# Altium footprint library 医疗床16x16.PcbLib: 38 footprints (part 3 of 3)
Each footprint in its own frame and in the unit in brackets; x right, y up, seen from the top. Pads: shape width x height; smd on the part's side, far side on the other; paste and mask are expansions set on the pad; w line width, h text height; cw(c..) or ccw(c..) is an arc to the next point about the centre after c.
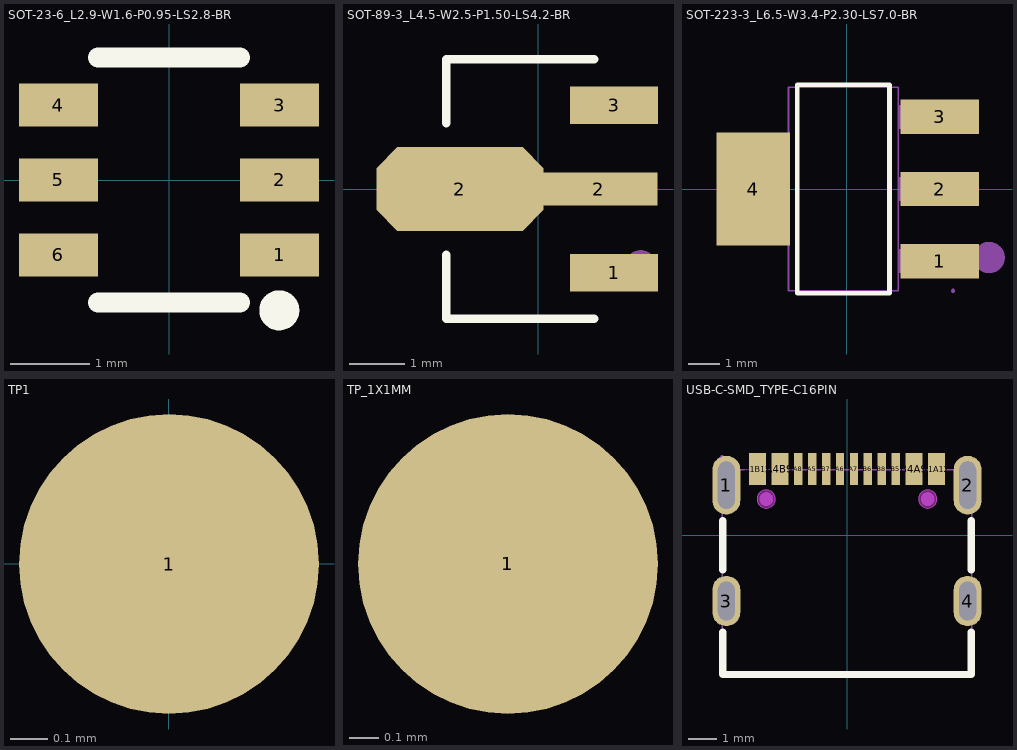
[diagram p2: the footprints below, top view; thin cyan lines are the x and y axes]

## SOT-23-6_L2.9-W1.6-P0.95-LS2.8-BR [mm]
pads (6):
  rect 1x0.55 smd: 1(1.4,-0.95) 2(1.4,0) 3(1.4,0.95) 4(-1.4,0.95) 5(-1.4,0) 6(-1.4,-0.95)
Top Overlay:
  circle w0.254: c1.397,-1.651 r0.127
  lines w0.254: -0.9,-1.55 0.9,-1.55 ; -0.9,1.55 0.9,1.55
Mechanical 15:
  circle w0.2: c1.4,-0.95 r0.1
3D body "SOT23-6.STEP": height 1.15, standoff -0.03, extent -1.403,-1.5 1.403,1.5

## SOT-89-3_L4.5-W2.5-P1.50-LS4.2-BR [mm]
pads (4):
  rect 1.575x0.672 smd: 1(1.356,-1.5) 3(1.356,1.5)
  oct 3x1.5 smd: 2(-1.405,0)
  rect 2.1x0.6 smd: 2(1.084,0)
Top Overlay:
  lines w0.152: -1.65,-1.177 -1.65,-2.326 1.002,-2.326 ; -1.65,1.177 -1.65,2.326 1.002,2.326
Top Solder:
  region: -2.283,0.959 -0.429,0.959 -0.385,0.958 -0.34,0.955 -0.296,0.949 -0.252,0.942 -0.208,0.933 -0.165,0.921 -0.123,0.908 -0.081,0.893 -0.04,0.875 0,0.856 0.039,0.835 0.078,0.812 0.115,0.788 0.151,0.761 0.185,0.733 0.219,0.704 0.25,0.673 0.281,0.64 0.31,0.606 0.337,0.571 0.362,0.534 0.386,0.497 0.408,0.458 0.428,0.418 0.446,0.339 2.144,0.339 2.144,-0.321 0.446,-0.321 0.428,-0.401 0.408,-0.44 0.386,-0.479 0.362,-0.517 0.337,-0.553 0.31,-0.588 0.281,-0.622 0.25,-0.655 0.219,-0.686 0.185,-0.716 0.151,-0.744 0.115,-0.77 0.078,-0.795 0.039,-0.818 0,-0.839 -0.04,-0.858 -0.081,-0.875 -0.123,-0.89 -0.165,-0.904 -0.208,-0.915 -0.252,-0.925 -0.296,-0.932 -0.34,-0.937 -0.385,-0.94 -0.429,-0.941 -2.283,-0.941 -2.328,-0.94 -2.372,-0.937 -2.416,-0.932 -2.46,-0.925 -2.504,-0.915 -2.547,-0.904 -2.59,-0.89 -2.631,-0.875 -2.672,-0.858 -2.713,-0.839 -2.752,-0.818 -2.79,-0.795 -2.827,-0.77 -2.863,-0.744 -2.898,-0.716 -2.931,-0.686 -2.963,-0.655 -2.993,-0.622 -3.022,-0.588 -3.049,-0.553 -3.075,-0.517 -3.098,-0.479 -3.12,-0.44 -3.141,-0.401 -3.159,-0.36 -3.175,-0.318 -3.19,-0.276 -3.202,-0.233 -3.212,-0.19 -3.221,-0.146 -3.227,-0.102 -3.231,-0.058 -3.233,-0.013 -3.233,0.031 -3.231,0.076 -3.227,0.12 -3.221,0.164 -3.212,0.208 -3.202,0.251 -3.19,0.294 -3.175,0.336 -3.159,0.377 -3.141,0.418 -3.12,0.458 -3.098,0.497 -3.075,0.534 -3.049,0.571 -3.022,0.606 -2.993,0.64 -2.963,0.673 -2.931,0.704 -2.898,0.733 -2.863,0.761 -2.827,0.788 -2.79,0.812 -2.752,0.835 -2.713,0.856 -2.672,0.875 -2.631,0.893 -2.59,0.908 -2.547,0.921 -2.504,0.933 -2.46,0.942 -2.416,0.949 -2.372,0.955 -2.328,0.958
Mechanical 15:
  circle w0.05: c-0.313,0 r0.35
  circle w0.3: c1.832,-1.397 r0.15
  lines w0.05: -0.813,0 0.187,0 ; -0.313,-0.5 -0.313,0.5
3D body "SOT89.STEP": height 1.6, standoff 0.04, extent -2.506,-2.286 1.794,2.314

## SOT-223-3_L6.5-W3.4-P2.30-LS7.0-BR [mm]
pads (4):
  rect 2.5x1.1 smd mask+0.051: 1(2.97,-2.3) 2(2.97,0) 3(2.97,2.3)
  rect 2.34x3.6 smd mask+0.051: 4(-2.97,0)
Top Overlay:
  lines w0.152: -1.571,-3.326 -1.571,3.326 1.371,3.326 1.371,-3.326 -1.571,-3.326
Mechanical 6:
  circle w0.5: c4.552,-2.188 r0.25
Mechanical 15:
  region: 3.46,-3.25 3.46,-3.225 3.425,-3.19 3.375,-3.19 3.34,-3.225 3.34,-3.25 3.34,-3.275 3.375,-3.31 3.425,-3.31 3.46,-3.275
  region: 1.64,1.925 1.64,2.675 2.66,2.675 2.66,1.925
  region: 2.65,1.925 2.65,2.675 3.4,2.675 3.4,1.925
  region: 1.64,-0.375 1.64,0.375 2.66,0.375 2.66,-0.375
  region: 2.65,-0.375 2.65,0.375 3.4,0.375 3.4,-0.375
  region: 1.64,-2.675 1.64,-1.925 2.66,-1.925 2.66,-2.675
  region: 2.65,-2.675 2.65,-1.925 3.4,-1.925 3.4,-2.675
  region: -2.86,-1.5 -2.86,1.5 -1.84,1.5 -1.84,-1.5
  region: -3.6,-1.5 -3.6,1.5 -2.85,1.5 -2.85,-1.5
  lines w0.051: -1.85,-3.25 -1.85,3.25 1.65,3.25 1.65,-3.25 -1.85,-3.25
3D body "3D_AMS1117-3.3V_2022-11-23.step": height 1.7, standoff -0.05, extent -3.555,-3.25 3.555,3.25

## TP1 [mm]
pads (1):
  round 0.8 smd: 1(0,0)

## TP_1X1MM [mm]
pads (1):
  round 1 smd: 1(-1267.968,-1268.501)

## USB-C-SMD_TYPE-C16PIN [mil]
pads (16):
  oval 39.4x82.7 hole 23.6 slot 66.9 at 90 deg mask+2: 1(-170.1,70.4) 2(170.1,70.4)
  oval 39.4x70.9 hole 23.6 slot 55.1 at 90 deg mask+2: 3(-170.1,-93) 4(170.1,-93)
  rect 23.6x45.3 smd mask+2: A1B12(-126,93) A4B9(-94.5,93) B1A12(126,93) B4A9(94.5,93)
  rect 11.8x45.3 smd mask+2: A5(-49.2,93) A6(-9.8,93) A7(9.8,93) A8(-68.9,93) B5(68.9,93) B6(29.5,93) B7(-29.5,93) B8(49.2,93)
Top Overlay:
  lines w10: -175.2,-137.1 -175.2,-196.8 175.2,-196.8 175.2,-137.1 ; -175.2,-48.9 -175.2,20.4 ; 175.2,-48.9 175.2,20.4
Top Paste:
  region: -189.8,92 -189.8,95.92 -186.8,103.16 -181.26,108.7 -174.02,111.7 -166.18,111.7 -158.94,108.7 -153.4,103.16 -150.4,95.92 -150.4,92 -150.4,48.7 -150.4,44.78 -153.4,37.54 -158.94,32 -166.18,29 -174.02,29 -181.26,32 -186.8,37.54 -189.8,44.78 -189.8,48.7
  region: 150.4,92 150.4,95.92 153.4,103.16 158.94,108.7 166.18,111.7 174.02,111.7 181.26,108.7 186.8,103.16 189.8,95.92 189.8,92 189.8,48.7 189.8,44.78 186.8,37.54 181.26,32 174.02,29 166.18,29 158.94,32 153.4,37.54 150.4,44.78 150.4,48.7
  region: -189.8,-77.3 -189.8,-73.38 -186.8,-66.14 -181.26,-60.6 -174.02,-57.6 -166.18,-57.6 -158.94,-60.6 -153.4,-66.14 -150.4,-73.38 -150.4,-77.3 -150.4,-108.8 -150.4,-112.72 -153.4,-119.96 -158.94,-125.5 -166.18,-128.5 -174.02,-128.5 -181.26,-125.5 -186.8,-119.96 -189.8,-112.72 -189.8,-108.8
  region: 150.4,-77.3 150.4,-73.38 153.4,-66.14 158.94,-60.6 166.18,-57.6 174.02,-57.6 181.26,-60.6 186.8,-66.14 189.8,-73.38 189.8,-77.3 189.8,-108.8 189.8,-112.72 186.8,-119.96 181.26,-125.5 174.02,-128.5 166.18,-128.5 158.94,-125.5 153.4,-119.96 150.4,-112.72 150.4,-108.8
  region: -74.8,115.6 -63,115.6 -63,70.4 -74.8,70.4
  region: -55.1,115.6 -43.3,115.6 -43.3,70.4 -55.1,70.4
  region: -35.4,115.6 -23.6,115.6 -23.6,70.4 -35.4,70.4
  region: -15.8,115.6 -3.9,115.6 -3.9,70.4 -15.8,70.4
  region: 3.9,115.6 15.7,115.6 15.7,70.4 3.9,70.4
  region: 23.6,115.6 35.4,115.6 35.4,70.4 23.6,70.4
  region: 43.3,115.6 55.1,115.6 55.1,70.4 43.3,70.4
  region: 63,115.6 74.8,115.6 74.8,70.4 63,70.4
  region: 82.7,115.6 106.3,115.6 106.3,70.4 82.7,70.4
  region: 114.2,115.6 137.8,115.6 137.8,70.4 114.2,70.4
  region: -106.3,115.6 -82.7,115.6 -82.7,70.4 -106.3,70.4
  region: -137.8,115.6 -114.2,115.6 -114.2,70.4 -137.8,70.4
Keep-Out Layer:
  board cut-out: -101,50.7 -101,53.25 -102.95,57.95 -106.55,61.55 -111.25,63.5 -116.35,63.5 -121.05,61.55 -124.65,57.95 -126.6,53.25 -126.6,50.7 -126.6,48.15 -124.65,43.45 -121.05,39.85 -116.35,37.9 -111.25,37.9 -106.55,39.85 -102.95,43.45 -101,48.15
  board cut-out: 126.6,50.7 126.6,53.25 124.65,57.95 121.05,61.55 116.35,63.5 111.25,63.5 106.55,61.55 102.95,57.95 101,53.25 101,50.7 101,48.15 102.95,43.45 106.55,39.85 111.25,37.9 116.35,37.9 121.05,39.85 124.65,43.45 126.6,48.15
Mechanical 1:
  circle w0.2: c-113.8,50.7 r12.8
  circle w0.2: c113.8,50.7 r12.8
Mechanical 6:
  circle w9.8: c113.8,50.7 r4.9
  circle w9.8: c-113.8,50.7 r4.9
Mechanical 15:
  region: -72.8,110.3 -65,110.3 -65,82.8 -72.8,82.8
  region: -176,-77.3 -164.2,-77.3 -164.2,-108.8 -176,-108.8
  region: 164.2,-77.3 176,-77.3 176,-108.8 164.2,-108.8
  region: 164.2,92 176,92 176,48.7 164.2,48.7
  region: -176,92 -164.2,92 -164.2,48.7 -176,48.7
  region: 65,110.3 72.8,110.3 72.8,82.8 65,82.8
  region: 45.3,110.3 53.1,110.3 53.1,82.8 45.3,82.8
  region: 25.6,110.3 33.5,110.3 33.5,82.8 25.6,82.8
  region: 5.9,110.3 13.8,110.3 13.8,82.8 5.9,82.8
  region: -13.8,110.3 -5.9,110.3 -5.9,82.8 -13.8,82.8
  region: -33.5,110.3 -25.6,110.3 -25.6,82.8 -33.5,82.8
  region: -53.1,110.3 -45.3,110.3 -45.3,82.8 -53.1,82.8
  region: 118.1,110.3 133.9,110.3 133.9,82.8 118.1,82.8
  region: 86.6,110.3 102.4,110.3 102.4,82.8 86.6,82.8
  region: -102.4,110.3 -86.6,110.3 -86.6,82.8 -102.4,82.8
  region: -133.9,110.3 -118.1,110.3 -118.1,82.8 -133.9,82.8
  region: -173.6,110.3 -173.6,111.29 -175.01,112.7 -176.99,112.7 -178.4,111.29 -178.4,110.3 -178.4,109.31 -176.99,107.9 -175.01,107.9 -173.6,109.31
  lines w2: -176,-197.3 176,-197.3 176,92.1 -176,92.1 -176,-197.3
3D body "3D_TYPEC-304-ACP16_2022-11-23.step": height 126.44, standoff -37.38, extent -175.98,-194.45 175.99,113.03